# Altium footprint library u025Library.PcbLib: 132 footprints (part 6 of 9)
Each footprint in its own frame and in the unit in brackets; x right, y up, seen from the top. Pads: shape width x height; smd on the part's side, far side on the other; paste and mask are expansions set on the pad; w line width, h text height; cw(c..) or ccw(c..) is an arc to the next point about the centre after c.
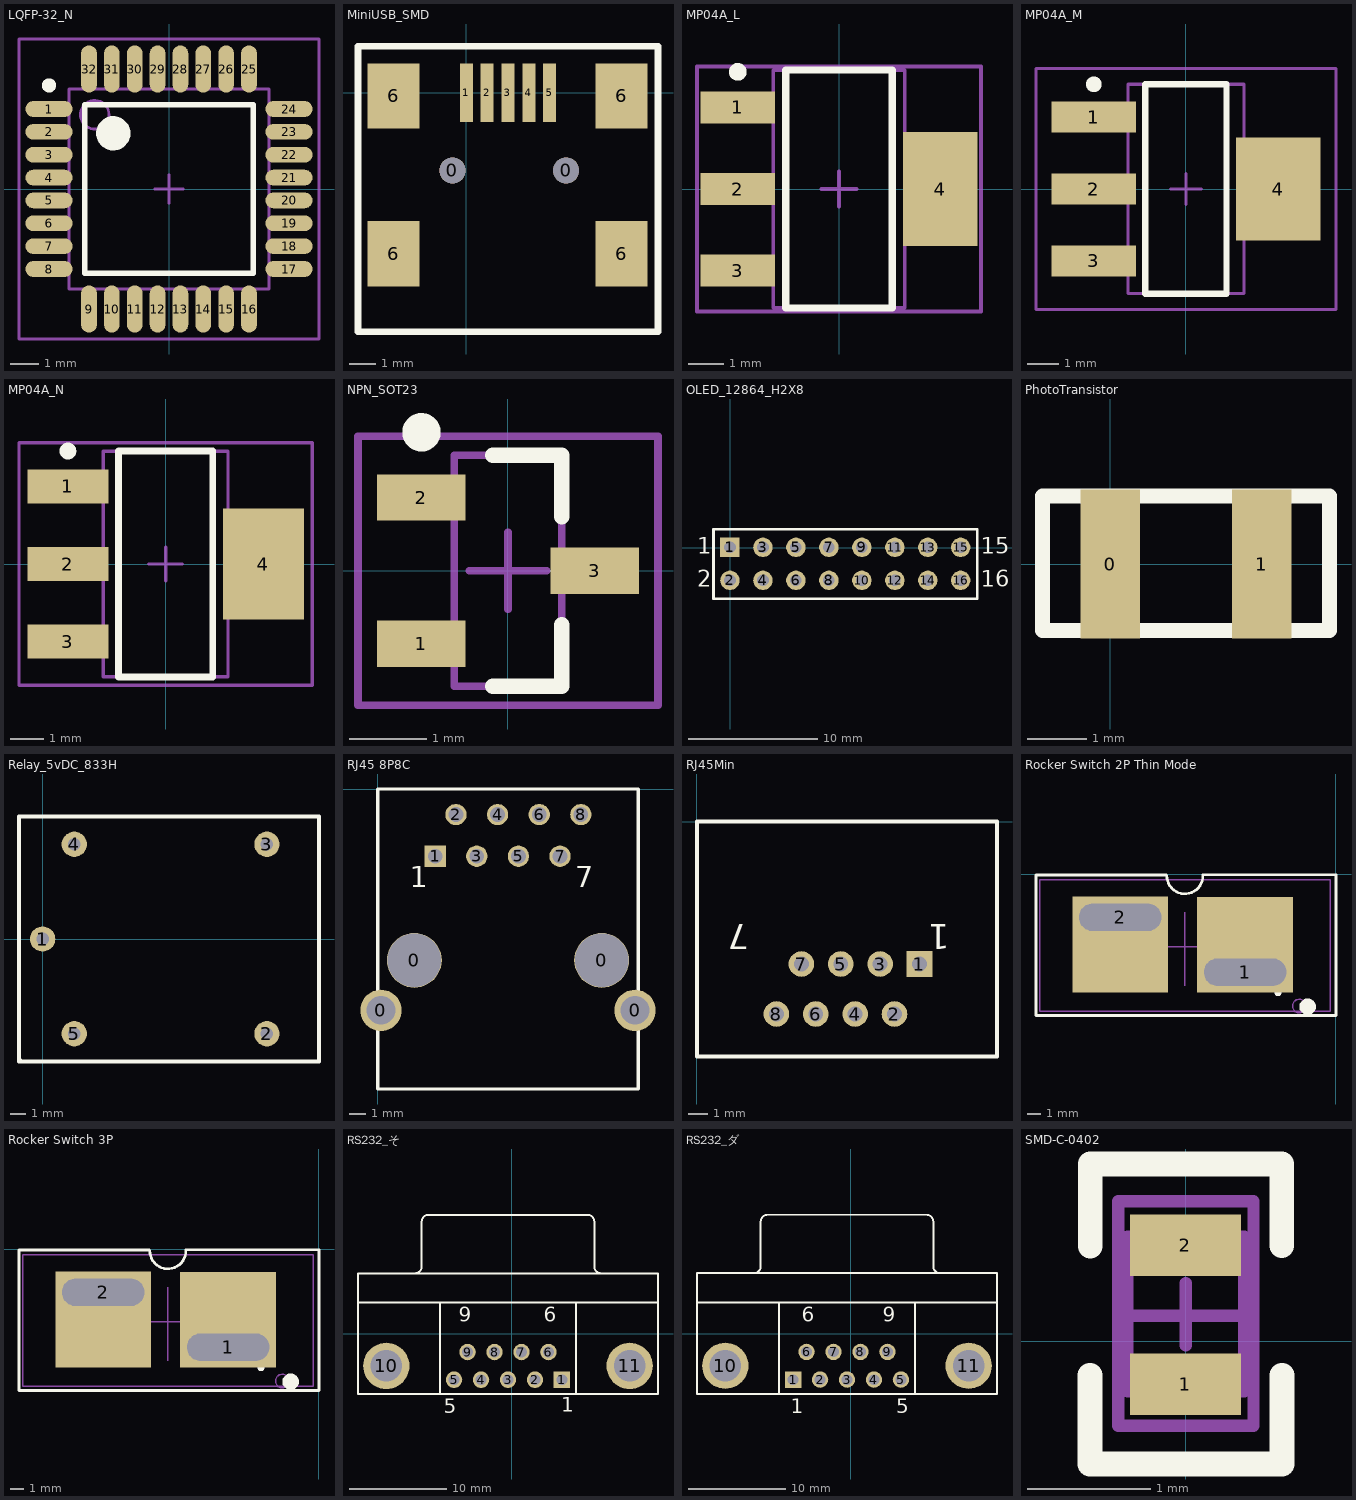
[diagram p5: the footprints below, top view; thin cyan lines are the x and y axes]

## LQFP-32_N [mm] "Thin QFP, 32-Leads, Body 7x7mm, Pitch 0.8mm, IPC Medium Density"
height 1.6
pads (32):
  oval 1.65x0.55 smd: 1(-4.2,2.8) 2(-4.2,2) 3(-4.2,1.2) 4(-4.2,0.4) 5(-4.2,-0.4) 6(-4.2,-1.2) 7(-4.2,-2) 8(-4.2,-2.8) 17(4.2,-2.8) 18(4.2,-2) 19(4.2,-1.2) 20(4.2,-0.4) 21(4.2,0.4) 22(4.2,1.2) 23(4.2,2) 24(4.2,2.8)
  oval 0.55x1.65 smd: 9(-2.8,-4.2) 10(-2,-4.2) 11(-1.2,-4.2) 12(-0.4,-4.2) 13(0.4,-4.2) 14(1.2,-4.2) 15(2,-4.2) 16(2.8,-4.2) 25(2.8,4.2) 26(2,4.2) 27(1.2,4.2) 28(0.4,4.2) 29(-0.4,4.2) 30(-1.2,4.2) 31(-2,4.2) 32(-2.8,4.2)
Top Overlay:
  circle w0.25: c-4.2,3.625 r0.125
  circle w0.6: c-1.95,1.95 r0.3
  lines w0.2: -2.95,-2.95 -2.95,2.95 2.95,2.95 2.95,-2.95 -2.95,-2.95
Mechanical 13:
  circle w0.1: c-2.6,2.6 r0.5
  lines w0.1: -3.5,-3.5 -3.5,3.5 3.5,3.5 3.5,-3.5 -3.5,-3.5
Mechanical 15:
  lines w0.1: -0.5,0 0.5,0 ; 0,-0.5 0,0.5 ; -5.25,-5.25 -5.25,5.25 5.25,5.25 5.25,-5.25 -5.25,-5.25
3D body: height 1.5, standoff 0.02, extent -4.474,-4.474 4.526,4.526
3D body: height 1.6, standoff 0, extent -3.5,-3.5 3.5,3.5

## MiniUSB_SMD [mm] "MiniUSB_SMD"
height 5
pads (11):
  round 1 hole 1: 0(-0.533,-2.997) 0(3.835,-2.997)
  rect 0.5x2.25 smd: 1(0,0) 2(0.8,0) 3(1.6,0) 4(2.4,0) 5(3.2,0)
  rect 2x2.5 smd: 6(-2.794,-6.198) 6(-2.794,-0.127) 6(5.969,-6.198) 6(5.969,-0.127)
Top Overlay:
  lines w0.254: -4.166,-9.195 -4.166,1.778 7.366,1.778 7.366,-9.195 -4.166,-9.195
3D body: height 3.95, standoff 0, extent -3.367,-8.781 6.533,0.219

## MP04A_L [mm] "SOT223, 4-Leads, Body 6.5x3.5mm, Pitch 2.3mm, Lead Span 7mm, IPC High Density"
height 1.8
pads (4):
  rect 2.1x0.9 smd: 1(-2.85,2.3) 2(-2.85,0) 3(-2.85,-2.3)
  rect 2.1x3.2 smd: 4(2.85,0)
Top Overlay:
  circle w0.25: c-2.85,3.3 r0.125
  lines w0.2: -1.5,-3.35 1.5,-3.35 1.5,3.35 -1.5,3.35 -1.5,-3.35
Mechanical 13:
  lines w0.1: -1.85,-3.35 1.85,-3.35 1.85,3.35 -1.85,3.35 -1.85,-3.35
Mechanical 15:
  lines w0.1: -0.5,0 0.5,0 ; 0,-0.5 0,0.5 ; -4,-3.45 4,-3.45 4,3.45 -4,3.45 -4,-3.45
3D body: height 1.7, standoff 0.02, extent -3.501,-3.225 3.459,3.275

## MP04A_M [mm] "SOT223, 4-Leads, Body 6.5x3.5mm, Pitch 2.3mm, Lead Span 7mm, IPC Low Density"
height 1.8
pads (4):
  rect 2.7x1 smd: 1(-2.95,2.3) 2(-2.95,0) 3(-2.95,-2.3)
  rect 2.7x3.3 smd: 4(2.95,0)
Top Overlay:
  circle w0.25: c-2.95,3.35 r0.125
  lines w0.2: -1.3,-3.35 -1.3,3.35 1.3,3.35 1.3,-3.35 -1.3,-3.35
Mechanical 13:
  lines w0.1: -1.85,-3.35 -1.85,3.35 1.85,3.35 1.85,-3.35 -1.85,-3.35
Mechanical 15:
  lines w0.1: -0.5,0 0.5,0 ; 0,-0.5 0,0.5 ; -4.8,-3.85 -4.8,3.85 4.8,3.85 4.8,-3.85 -4.8,-3.85
3D body: height 1.7, standoff 0.02, extent -3.525,-3.256 3.436,3.244

## MP04A_N [mm] "SOT223, 4-Leads, Body 6.5x3.5mm, Pitch 2.3mm, Lead Span 7mm, IPC Medium Density"
height 1.8
pads (4):
  rect 2.4x1 smd: 1(-2.9,2.3) 2(-2.9,0) 3(-2.9,-2.3)
  rect 2.4x3.3 smd: 4(2.9,0)
Top Overlay:
  circle w0.25: c-2.9,3.35 r0.125
  lines w0.2: -1.4,-3.35 1.4,-3.35 1.4,3.35 -1.4,3.35 -1.4,-3.35
Mechanical 13:
  lines w0.1: -1.85,-3.35 1.85,-3.35 1.85,3.35 -1.85,3.35 -1.85,-3.35
Mechanical 15:
  lines w0.1: -0.5,0 0.5,0 ; 0,-0.5 0,0.5 ; -4.35,-3.6 4.35,-3.6 4.35,3.6 -4.35,3.6 -4.35,-3.6
3D body: height 1.7, standoff 0.02, extent -3.394,-3.254 3.566,3.246

## NPN_SOT23 [mm] "NPN_SOT23"
height 2
pads (3):
  rect 1.15x0.6 smd: 1(-1.125,-0.95) 2(-1.125,0.95) 3(1.125,0)
Top Overlay:
  circle w0.25: c-1.125,1.8 r0.125
  lines w0.2: -0.2,-1.5 0.7,-1.5 0.7,-0.7 ; -0.2,1.5 0.7,1.5 0.7,0.7
Mechanical 13:
  lines w0.1: -0.7,-1.5 0.7,-1.5 0.7,1.5 -0.7,1.5 -0.7,-1.5
Mechanical 15:
  lines w0.1: -0.5,0 0.5,0 ; 0,-0.5 0,0.5 ; -1.95,-1.75 1.95,-1.75 1.95,1.75 -1.95,1.75 -1.95,-1.75
3D body: height 0.94, standoff -0.04, extent -1.172,-1.485 1.376,1.435

## OLED_12864_H2X8 [mm] "Connector; Header; 8x2 Position"
pads (16):
  rect 1.5x1.5 hole 0.9: 1(-0.024,0.016)
  round 1.5 hole 0.9: 2(-0.024,-2.524) 3(2.516,0.016) 4(2.516,-2.524) 5(5.056,0.016) 6(5.056,-2.524) 7(7.596,0.016) 8(7.596,-2.524) 9(10.136,0.016) 10(10.136,-2.524) 11(12.676,0.016) 12(12.676,-2.524) 13(15.216,0.016) 14(15.216,-2.524) 15(17.756,0.016) 16(17.756,-2.524)
Top Overlay:
  lines w0.2: -1.294,-3.956 19.026,-3.956 19.026,1.419 -1.294,1.419 -1.294,-3.956
  text "16" at 19.28,-3.032 h1.27
  text "2" at -2.564,-3.032 h1.27
  text "1" at -2.564,-0.492 h1.27
  text "15" at 19.28,-0.492 h1.27

## PhotoTransistor [mm] "PhotoTransistor"
height 5
pads (2):
  rect 1x2.5 smd: 0(0,0) 1(2.54,0)
Top Overlay:
  lines w0.254: -1.143,-1.118 3.683,-1.118 3.683,1.143 -1.143,1.143 -1.143,-1.118
3D body: height 5.04, standoff -12.74, extent -1.143,-1.989 3.297,1.126

## Relay_5vDC_833H [mm] "Relay_5vDC_833H"
height 18.5
pads (5):
  round 1.6 hole 0.8: 1(0,0) 2(14.2,-6) 3(14.2,6) 4(2,6) 5(2,-6)
Top Overlay:
  lines w0.254: -1.424,-7.674 -1.5,-7.75 ; -1.5,-7.75 -1.5,0 -1.5,7.75 17.5,7.75 17.5,-7.75 -1.5,-7.75
3D body: height 1.5, standoff -15.21, extent -1.378,-7.741 17.622,7.759

## RJ45 8P8C [mm] "RJ45 8P8C"
pads (12):
  round 2.524 hole 1.75: 0(0.2,-13.5) 0(15.7,-13.5)
  round 3.35 hole 3.25: 0(2.235,-10.45) 0(13.665,-10.45)
  rect 1.3x1.3 hole 0.9: 1(3.505,-4.1)
  round 1.3 hole 0.9: 2(4.775,-1.56) 3(6.045,-4.1) 4(7.315,-1.56) 5(8.585,-4.1) 6(9.855,-1.56) 7(11.125,-4.1) 8(12.395,-1.56)
Top Overlay:
  lines w0.203: 15.898,-18.3 15.898,0 ; 15.898,-18.279 15.877,-18.3 0,-18.3 0,0 15.9,0
  text "7" at 12.05,-6 h1.27
  text "1" at 1.962,-6 h1.27

## RJ45Min [mm] "RJ45Min"
pads (8):
  rect 1.3x1.3 hole 0.75: 1(11.309,-7.227)
  round 1.3 hole 0.75: 2(10.039,-9.767) 3(9.309,-7.227) 4(8.039,-9.767) 5(7.309,-7.227) 6(6.039,-9.767) 7(5.309,-7.227) 8(4.039,-9.767)
Top Overlay:
  lines w0.203: 0.006,-11.926 15.246,-11.926 15.246,0.012 0.006,0.012 0.006,-11.926
  text "1" at 12.833,-5.195 h1.27
  text "7" at 2.673,-5.195 h1.27

## Rocker Switch 2P Thin Mode [mm] "Rocker Switch 2P Thin Mode"
height 5.6
pads (2):
  rect 7x7 hole 2 slot 6 at 0 deg copper offset 0,2: 1(-6.597,-7.138)
  rect 7x7 hole 2 slot 6 at 0 deg copper offset 0,-2: 2(-15.716,-3.128)
Top Overlay:
  circle w0.6: c-2.038,-9.66 r0.3
  circle w0.25: c-4.198,-8.64 r0.125
  lines w0.2: -12.365,-0.042 -21.866,-0.042 -21.866,-10.294 0.036,-10.294 0.036,-0.016 -9.698,-0.016 ; -12.313,-0.094 ccw(c-11,-0.104) -9.687,-0.067
Mechanical 13:
  circle w0.1: c-2.638,-9.61 r0.5
  lines w0.1: -21.581,-9.983 -0.379,-9.983 -0.379,-0.379 -21.581,-0.379 -21.581,-9.983
Mechanical 15:
  lines w0.1: -14.876,-5.293 -7.161,-5.293 ; -11.003,-8.119 -11.003,-2.76
3D body: height 20, standoff -9.18, extent -21.54,-9.964 -0.458,-0.465

## Rocker Switch 3P [mm] "Rocker Switch 3P"
height 5.6
pads (2):
  rect 7x7 hole 2 slot 6 at 0 deg copper offset 0,2: 1(-6.597,-7.138)
  rect 7x7 hole 2 slot 6 at 0 deg copper offset 0,-2: 2(-15.716,-3.128)
Top Overlay:
  circle w0.25: c-4.198,-8.64 r0.125
  circle w0.6: c-2.038,-9.66 r0.3
  lines w0.2: -12.365,-0.042 -21.866,-0.042 -21.866,-10.294 0.036,-10.294 0.036,-0.016 -9.698,-0.016 ; -12.313,-0.094 ccw(c-11,-0.104) -9.687,-0.067
Mechanical 13:
  circle w0.1: c-2.638,-9.61 r0.5
  lines w0.1: -21.581,-9.983 -21.581,-0.379 -0.379,-0.379 -0.379,-9.983 -21.581,-9.983
Mechanical 15:
  lines w0.1: -14.876,-5.293 -7.161,-5.293 ; -11.003,-8.119 -11.003,-2.76
3D body: height 20, standoff -9.18, extent -21.54,-9.964 -0.458,-0.465

## RS232_そ [mm] "RS232_そ"
pads (11):
  rect 1.69x1.69 hole 1.09: 1(5.159,-4.697)
  round 1.69 hole 1.09: 2(2.389,-4.697) 3(-0.381,-4.697) 4(-3.151,-4.697) 5(-5.921,-4.697) 6(3.774,-1.857) 7(1.004,-1.857) 8(-1.766,-1.857) 9(-4.536,-1.857)
  round 4.76 hole 3.26: 10(-12.876,-3.277) 11(12.114,-3.277)
Top Overlay:
  lines w0.2: -15.781,3.223 15.019,3.223 ; -9.941,6.228 ccw(c-9.941,6.923) -9.246,6.923 -9.246,11.523 ; -9.241,11.528 cw(c-8.546,11.528) -8.546,12.223 7.784,12.223 cw(c7.784,11.528) 8.479,11.528 ; -7.381,-6.177 -7.381,3.223 ; 6.619,-6.177 6.619,3.223 ; 8.484,11.523 8.484,6.923 ccw(c9.179,6.923) 9.179,6.228 ; -15.781,-6.177 15.019,-6.177 15.019,6.223 -15.781,6.223 -15.781,-6.177
  text "6" at 3.302,1.27 h1.5
  text "9" at -5.461,1.27 h1.5
  text "5" at -6.985,-8.128 h1.5
  text "1" at 5.08,-8.001 h1.5
3D body: height 6.25, standoff -10.05, extent -15.202,-6.299 15.608,12.901

## RS232_ダ [mm] "RS232_ダ"
pads (11):
  rect 1.69x1.69 hole 1.09: 1(-5.921,-4.697)
  round 1.69 hole 1.09: 2(-3.151,-4.697) 3(-0.381,-4.697) 4(2.389,-4.697) 5(5.159,-4.697) 6(-4.536,-1.857) 7(-1.766,-1.857) 8(1.004,-1.857) 9(3.774,-1.857)
  round 4.76 hole 3.26: 10(-12.876,-3.277) 11(12.114,-3.277)
Top Overlay:
  lines w0.2: -15.781,3.223 15.019,3.223 ; -9.941,6.228 ccw(c-9.941,6.923) -9.246,6.923 -9.246,11.523 ; -9.241,11.528 cw(c-8.546,11.528) -8.546,12.223 7.784,12.223 cw(c7.784,11.528) 8.479,11.528 ; -7.381,-6.177 -7.381,3.223 ; 6.619,-6.177 6.619,3.223 ; 8.484,11.523 8.484,6.923 ccw(c9.179,6.923) 9.179,6.228 ; -15.781,-6.177 -15.781,6.223 15.019,6.223 15.019,-6.177 -15.781,-6.177
  text "1" at -6.171,-8.152 h1.5
  text "5" at 4.659,-8.152 h1.5
  text "9" at 3.274,1.248 h1.5
  text "6" at -5.036,1.248 h1.5
3D body: height 6.25, standoff -10.05, extent -15.989,-6.388 14.821,12.012

## SMD-C-0402 [mm] "Chip, Body 10x0.4mm, IPC High Density"
height 0.45
pads (2):
  rect 0.9x0.5 smd: 1(-0.003,-0.348) 2(-0.003,0.782)
Top Overlay:
  lines w0.2: -0.78,-0.277 -0.78,-0.998 0.774,-0.998 ; -0.78,0.774 -0.78,1.443 0.782,1.443 0.782,0.778 ; 0.782,-0.998 0.782,-0.277
Mechanical 13:
  lines w0.1: -0.475,-0.409 -0.475,0.85 0.475,0.85 0.475,-0.409 -0.475,-0.409
Mechanical 15:
  lines w0.1: -0.473,0.209 0.477,0.209 ; 0,-0.034 0,0.475 ; -0.55,-0.688 0.55,-0.688 0.55,1.14 -0.55,1.14 -0.55,-0.688
3D body: height 0.6, standoff 0, extent -0.254,-0.27 0.246,0.73